# Altium footprint library hphonglib.PcbLib: 1250 footprints (part 74 of 79)
Each footprint in its own frame and in the unit in brackets; x right, y up, seen from the top. Pads: shape width x height; smd on the part's side, far side on the other; paste and mask are expansions set on the pad; w line width, h text height; cw(c..) or ccw(c..) is an arc to the next point about the centre after c.
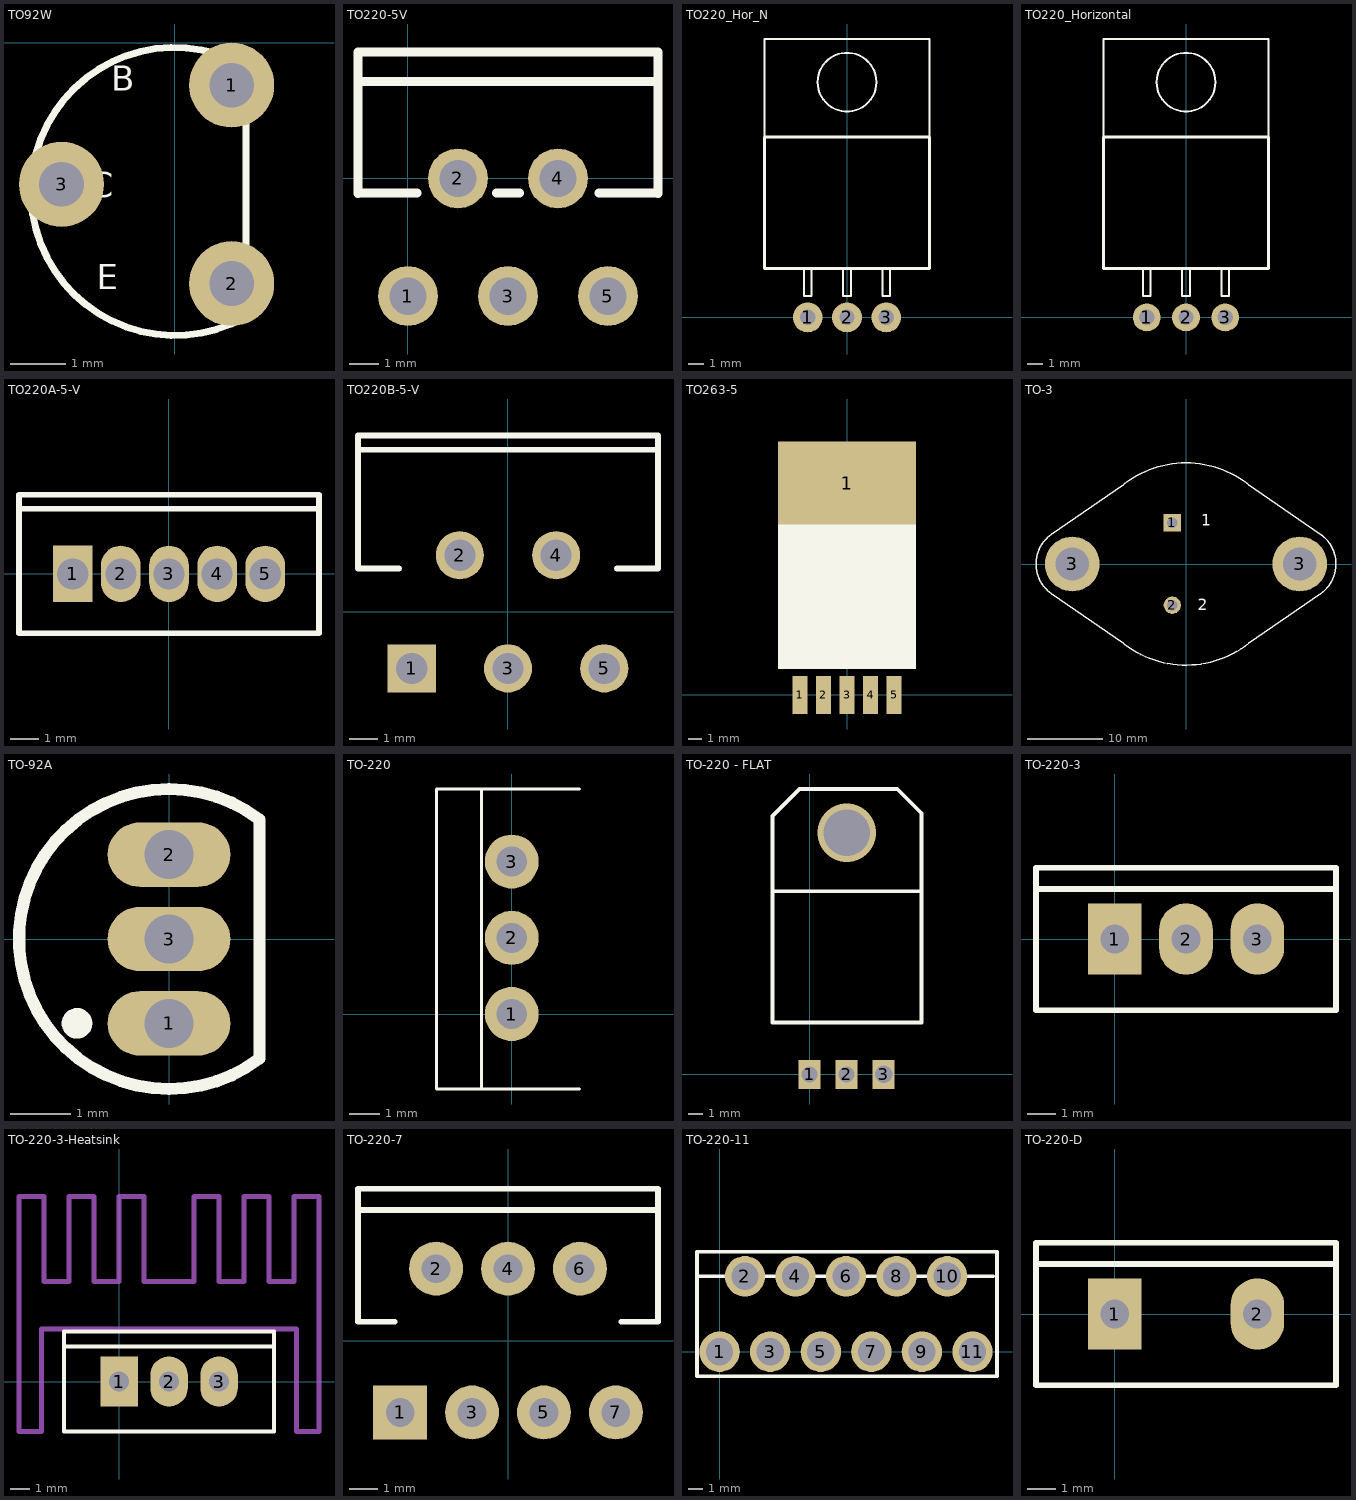
[diagram p73: the footprints below, top view; thin cyan lines are the x and y axes]

## TO92W [mil]
pads (3):
  round 60 hole 31.49 unplated: 1(40,-30) 2(40,-170) 3(-80,-100)
Top Overlay:
  lines w5: 49.1,-193.94 cw(c0,-105) 49.1,-16.06 ; 50,-195 50,-15
  text "E" at -55,-180 h30
  text "B" at -45,-40 h30
  text "C" at -60,-115 h30
Bottom Overlay:
  lines w5: 49.1,-193.94 cw(c0,-105) 49.1,-16.06 ; 50,-195 50,-15
3D body: height 314.96, standoff 157.48, extent -89.57,-194.57 48.23,-17.4
3D body: height 196.85, standoff -39.37, extent -10.83,-16.39 12.7,7.18
3D body: height 196.85, standoff -39.37, extent -11.76,-117.8 11.76,-94.22
3D body: height 196.85, standoff -39.37, extent -10.83,-216.2 12.7,-192.62

## TO220-5V [mil] "TO220 5-lead, molded, stagger bend package."
height 708.66
pads (5):
  round 80 hole 50: 1(0,-157.48) 2(66.93,0) 3(133.86,-157.48) 4(200.79,0) 5(267.72,-157.48)
Top Overlay:
  lines w12: -66.93,-20.08 -66.93,129.92 ; -66.93,-19.68 11.81,-19.68 ; -66.93,129.29 -66.93,169.29 ; -65.35,129.92 334.65,129.92 334.65,-20.08 ; -65.35,169.29 334.65,169.29 334.65,129.29 ; 118.11,-19.68 149.61,-19.68 ; 255.91,-19.68 334.65,-19.68

## TO220_Hor_N [mil] "TO, Thru-Hole, Horizontal Heatsink Mounted; 3 In-Line Leads; Pitch 2.54 mm"
height 763.78
pads (3):
  round 76 hole 39.37: 1(-100,0) 2(0,0) 3(100,0)
Top Overlay:
  circle w5: c0,600 r75
  lines w5: -210,460 -210,710 210,710 210,460 ; -110,125 -110,55 -90,55 -90,125 ; -10,125 -10,55 10,55 10,125 ; 90,125 90,55 110,55 110,125
  lines w7.87: -210,125 -210,460 210,460 210,125 -210,125
Bottom Overlay:
  lines w3.94: -157.48,-55.12 -157.48,57.09 160.43,57.09 160.43,-55.12 -157.48,-55.12
3D body "TO-220-Hor.STEP": height 165.35, standoff -118.11, extent -201,-12 199,755.32

## TO220_Horizontal [mm] "TO, Thru-Hole, Horizontal Heatsink Mounted; 3 In-Line Leads; Pitch 2.54 mm"
height 19.4
pads (3):
  round 1.8 hole 1: 1(-2.54,0) 2(0,0) 3(2.54,0)
Top Overlay:
  circle w0.127: c0,15.24 r1.905
  lines w0.127: -5.334,11.684 -5.334,18.034 5.334,18.034 5.334,11.684 ; -2.794,3.175 -2.794,1.397 -2.286,1.397 -2.286,3.175 ; -0.254,3.175 -0.254,1.397 0.254,1.397 0.254,3.175 ; 2.286,3.175 2.286,1.397 2.794,1.397 2.794,3.175
  lines w0.2: -5.334,3.175 -5.334,11.684 5.334,11.684 5.334,3.175 -5.334,3.175
Bottom Overlay:
  lines w0.1: -4,-1.4 -4,1.45 4.075,1.45 4.075,-1.4 -4,-1.4
3D body: height 4.5, standoff 0.1, extent -5.075,3.325 5.075,11.7
3D body: height 1.4, standoff 0.1, extent 0,11.575 5.1,17.9
3D body: height 1.4, standoff 0.1, extent -5.075,11.575 0,17.9

## TO220A-5-V [mm] "TO, Thru-Hole, Vertical, Heatsink Mounted; 5 In-Line Leads; Pitch 1.70 mm"
height 15.3
pads (5):
  rect 1.4x2 hole 1.1: 1(-3.4,0)
  oval 1.4x2 hole 1.1: 2(-1.7,0) 3(0,0) 4(1.7,0) 5(3.4,0)
Top Overlay:
  lines w0.2: -5.3,2.3 5.3,2.3 ; -5.3,-2.1 -5.3,2.8 5.3,2.8 5.3,-2.1 -5.3,-2.1

## TO220B-5-V [mm] "TO, Thru-Hole, Vertical, Heatsink Mounted; 5 Bent Staggered Leads; Pitch 1.7 mm"
height 21.1
pads (5):
  rect 1.7x1.7 hole 1.1: 1(-3.4,-2)
  round 1.7 hole 1.1: 2(-1.7,2) 3(0,-2) 4(1.7,2) 5(3.4,-2)
Top Overlay:
  lines w0.2: -5.3,5.73 5.3,5.73 ; -3.854,1.53 -5.3,1.53 -5.3,6.23 5.3,6.23 5.3,1.53 3.854,1.53
3D body "SW3dPS-TO220-5.STEP": height 21.35, standoff -2.64, extent -5.08,-2 5.08,6.24

## TO263-5 [mm] "LM2576-SMD"
pads (6):
  rect 1.07x2.75 smd: 1(-3.4,-0.025) 2(-1.7,-0.025) 3(0,-0.025) 4(1.7,-0.025) 5(3.4,-0.025)
  rect 10x6 smd: 1(0,15.289)
Top Overlay:
  rectangle: -5,1.854 5,12.878
3D body "SW3dPS-TO263-5.STEP": height 4.79, standoff -0.01, extent -5,-0.381 5,15.289

## TO-3 [mm] "Oval Flange Mount with (2) Offset Leads; Pin Spacing 10.92 mm; Lead Dia. 1.06 mm (max)"
height 8.38
pads (4):
  rect 2.3x2.3 hole 1.4: 1(-1.815,5.46)
  round 2.3 hole 1.4: 2(-1.815,-5.46)
  round 7.25 hole 4.4: 3(-15.075,0) 3(15.075,0)
Top Overlay:
  lines w0.2: -17.84,-3.93 -8.299,-10.521 ; -17.84,3.94 -8.299,10.521 ; -17.828,-3.932 cw(c-15.075,0) -17.828,3.932 ; -8.613,-10.265 ccw(c0,0) 8.298,-10.521 17.82,-3.94 ; -8.613,10.265 cw(c0,0) 8.613,10.265 ; 8.299,10.521 17.68,4.03 ; 17.689,4.026 cw(c15.075,0) 17.828,-3.932
  text "2" at 1.524,-6.096 h1.5
  text "1" at 2.032,5.08 h1.5
3D body "User Library-LM317_TO3.step": height 8.69, standoff -10.91, extent -19.298,-12.475 19.502,12.525

## TO-92A [mil] "TO, Flat Index; 3 In-Line, Axial Leads; Body Dia. 4.5mm; Leads 0.51 x 0.48 mm (max); ECB Position"
height 270.08
pads (3):
  oval 80x42 hole 32: 1(0,-55) 2(0,55) 3(0,0)
Top Overlay:
  circle w10: c-60,-55 r5
  lines w7.87: 59.06,-77.95 cw(c0,0) 59.06,77.95 59.05,-77.95
3D body "User Library-TO-92A.step": height 214.96, standoff -218.11, extent -93.49,-94.48 61.24,94.5

## TO-220 [mm]
pads (3):
  round 1.8 hole 1: 1(0,0) 2(0,2.54) 3(0,5.08)
Top Overlay:
  lines w0.1: -1,-2.5 -1,7.5 ; 2.25,-2.5 -2.5,-2.5 -2.5,7.5 2.25,7.5
Bottom Overlay:
  lines w0.1: -1.725,-1.4 1.625,-1.4 1.625,6.5 -1.725,6.5 -1.725,-1.4
Mechanical 13:
  text ".Designator" at 0.635,0.457 h2.03
3D body: height 4, standoff 1, extent -0.3,4.43 0.2,5.73
3D body: height 4, standoff 1, extent -0.3,1.89 0.2,3.19
3D body: height 1, standoff -9, extent -0.3,4.68 0.2,5.48
3D body: height 1, standoff -9, extent -0.3,2.14 0.2,2.94
3D body: height 19.7, standoff 18.4, extent -2.4,-2.45 -1.1,7.45
3D body: height 18.4, standoff 16.7, extent -2.4,-1.85 -1.1,6.85
3D body: height 1, standoff -9, extent -0.3,-0.4 0.2,0.4
3D body: height 4, standoff 1, extent -0.3,-0.65 0.2,0.65
3D body: height 13, standoff 4, extent -2.4,-2.45 2.1,7.45
3D body: height 16.7, standoff 13, extent -2.4,-2.45 -1.1,7.45

## TO-220 - FLAT [mm]
pads (3):
  rect 1.5x2 hole 1.1: 1(0,0) 2(2.54,0)
  rect 1.5x2 hole 1.2: 3(5.08,0)
via 2.54,16.562 diameter 4 hole 3.2
Top Overlay:
  lines w0.254: -2.54,5.861 -2.54,17.71 -0.686,19.564 6.007,19.564 7.671,17.901 7.671,3.562 -2.54,3.562 -2.54,12.554 7.671,12.554
3D body "TO220_NAM.step": height 4.45, standoff -1.79, extent -2.54,-0.19 7.62,19.09

## TO-220-3 [mil] "TO-220; 3 Leads; Solder Pad 35mil"
pads (3):
  rect 75x100 hole 40: 1(0,0)
  oval 75x100 hole 40: 2(100,0) 3(200,0)
Top Overlay:
  lines w7.87: -110,70 310,70 ; -110,-100 310,-100 310,100 -110,100 -110,-100
3D body "User Library-TO-220-1.step": height 760.24, standoff -372.83, extent -94.88,-83.16 294.88,94

## TO-220-3-Heatsink [mil] "TO-220; Heatsink; 3 Leads; Solder Pad 35mil"
pads (3):
  rect 75x100 hole 40: 1(0,0)
  oval 75x100 hole 40: 2(100,0) 3(200,0)
Top Overlay:
  lines w7.87: -110,70 310,70 ; -110,-100 310,-100 310,100 -110,100 -110,-100
Mechanical 1:
  lines w10: -200,-100 -200,370 ; 400,-100 400,370
Mechanical 13:
  lines w10: -200,-100 -155,-100 -155,105 355,105 355,-100 400,-100 ; -200,370 -150,370 -150,200 -100,200 -100,370 -50,370 -50,200 0,200 0,370 50,370 50,200 150,200 150,370 200,370 200,200 250,200 250,370 300,370 300,200 350,200 350,370 400,370
3D body "User Library-TO-220-1.step": height 810.24, standoff -322.83, extent -94.88,-83.16 294.88,94
3D body "User Library-heatsink TO126.step": height 985.25, standoff -148.61, extent -191,-76.63 390.94,348.62

## TO-220-7 [mil] "TO-220; 7 Bent Staggered Leads; Solder Pad 35mil"
height 830.71
pads (7):
  rect 75x75 hole 40: 1(-150,-100)
  round 75 hole 40: 2(-100,100) 3(-50,-100) 4(0,100) 5(50,-100) 6(100,100) 7(150,-100)
Top Overlay:
  lines w7.87: -208.66,181.73 208.66,181.73 ; -157.48,26.38 -208.66,26.38 -208.66,211.42 208.66,211.42 208.66,26.38 157.48,26.38
3D body "User Library-TO-220(T).step": height 766.77, standoff -67.87, extent -200.57,-110.03 201,212.02

## TO-220-11 [mil] "TO-220; 11 Bent Staggered Leads; Solder Pad 35mil"
pads (11):
  round 107 hole 72: 1(0,0) 2(67,200) 3(134,0) 4(201,200) 5(268,0) 6(335,200) 7(402,0) 8(469,200) 9(536,0) 10(603,200) 11(670,0)
Top Overlay:
  lines w10: -55,200 725,200 ; -60,-65 -60,265 735,265 735,-65 -60,-65

## TO-220-D [mil] "TO-220; Diode; 2 Leads; Solder Pad 35mil"
pads (2):
  rect 75x100 hole 40: 1(0,0)
  oval 75x100 hole 40: 2(200,0)
Top Overlay:
  lines w7.87: -110,70 310,70 ; -110,-100 310,-100 310,100 -110,100 -110,-100
3D body "User Library-TO-220-D.STEP": height 740.24, standoff -392.83, extent -94.88,-83.16 294.89,94